# Altium footprint library CAP_TH.PcbLib: 220 footprints (part 13 of 14)
Each footprint in its own frame and in the unit in brackets; x right, y up, seen from the top. Pads: shape width x height; smd on the part's side, far side on the other; paste and mask are expansions set on the pad; w line width, h text height; cw(c..) or ccw(c..) is an arc to the next point about the centre after c.
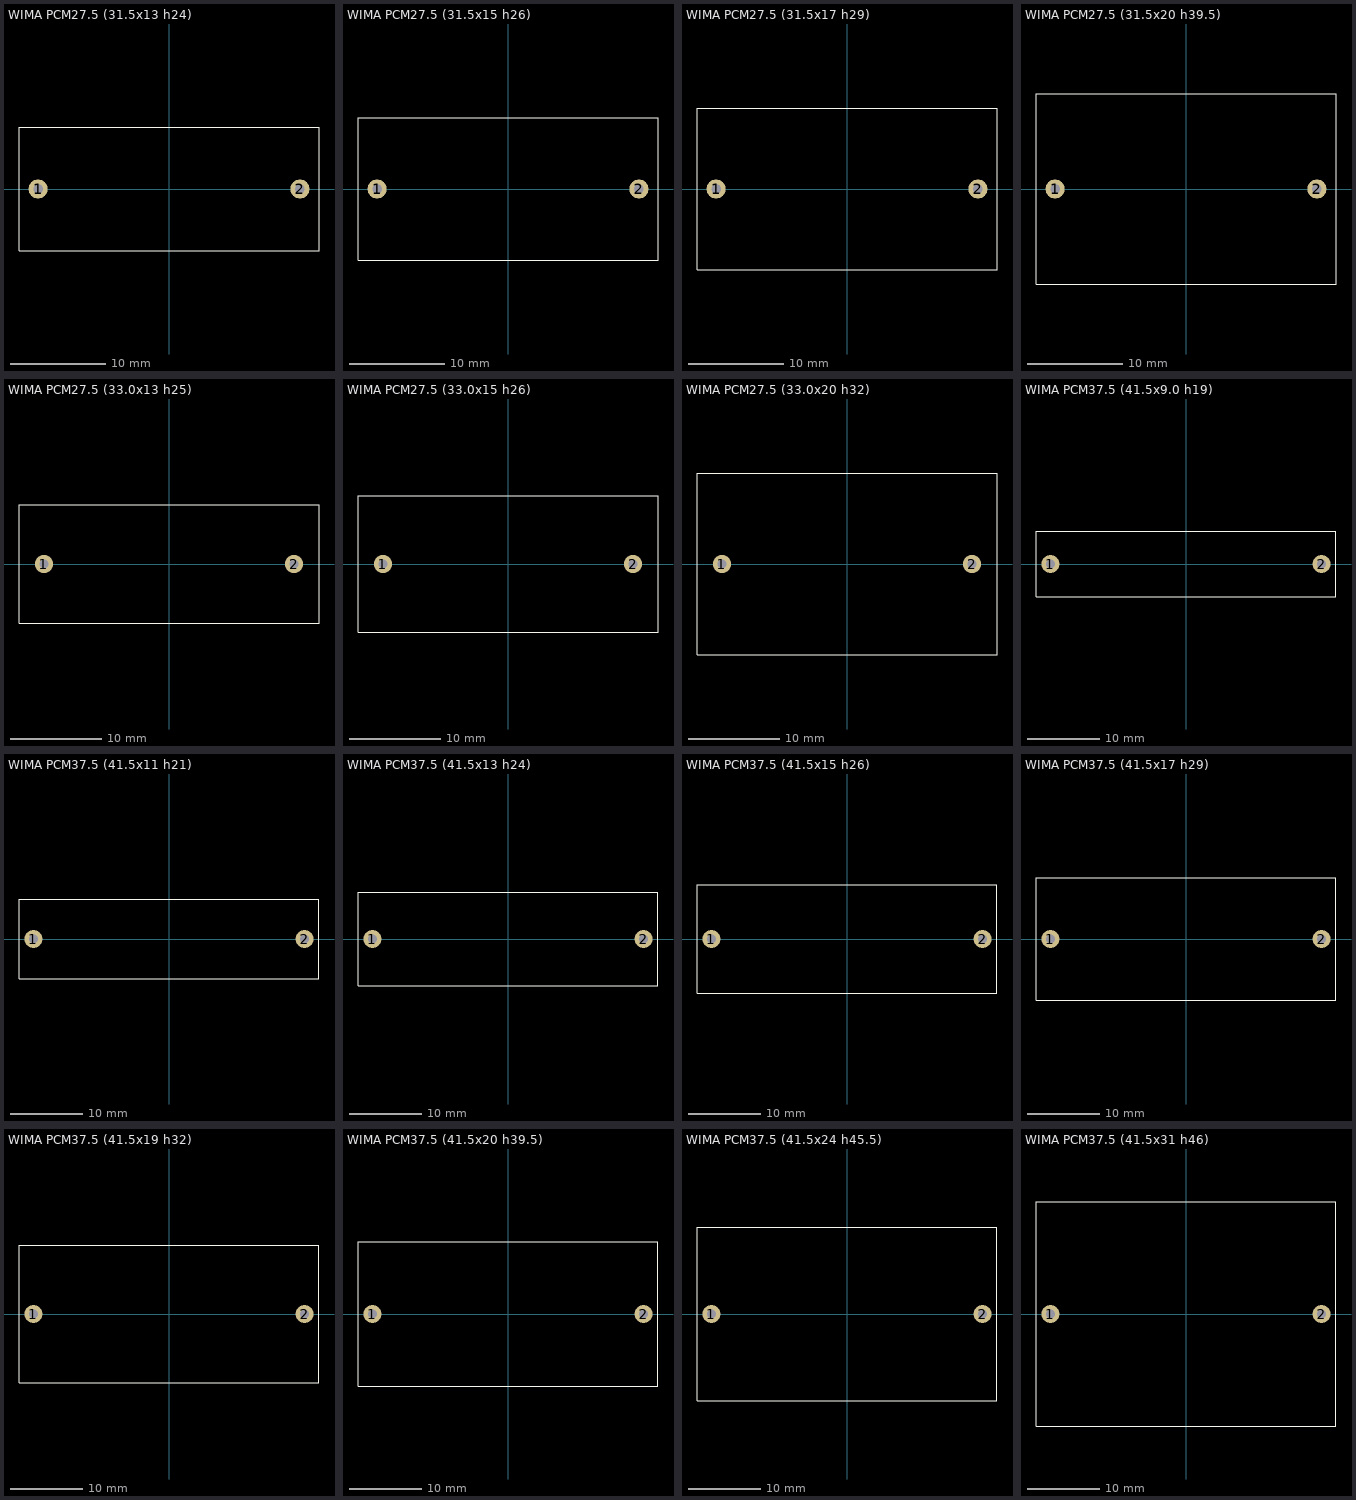
[diagram p12: the footprints below, top view; thin cyan lines are the x and y axes]

## WIMA PCM27.5 (31.5x13 h24) [mm]
pads (2):
  round 2 hole 1: 1(-13.75,0) 2(13.75,0)
Top Overlay:
  lines w0.1: -15.75,-6.5 -15.75,6.5 15.75,6.5 15.75,-6.5 -15.75,-6.5
3D body "WIMA PCM27.5 (31.5x13 h24).STEP": height 24, standoff -2, extent -15.75,-6.5 15.75,6.5

## WIMA PCM27.5 (31.5x15 h26) [mm]
pads (2):
  round 2 hole 1: 1(-13.75,0) 2(13.75,0)
Top Overlay:
  lines w0.1: -15.75,-7.5 -15.75,7.5 15.75,7.5 15.75,-7.5 -15.75,-7.5
3D body "WIMA PCM27.5 (31.5x15 h26).STEP": height 26, standoff -2, extent -15.75,-7.5 15.75,7.5

## WIMA PCM27.5 (31.5x17 h29) [mm]
pads (2):
  round 2 hole 1: 1(-13.75,0) 2(13.75,0)
Top Overlay:
  lines w0.1: -15.75,-8.5 -15.75,8.5 15.75,8.5 15.75,-8.5 -15.75,-8.5
3D body "WIMA PCM27.5 (31.5x17 h29).STEP": height 34.5, standoff -2, extent -15.75,-8.5 15.75,8.5

## WIMA PCM27.5 (31.5x20 h39.5) [mm]
pads (2):
  round 2 hole 1: 1(-13.75,0) 2(13.75,0)
Top Overlay:
  lines w0.1: -15.75,-10 -15.75,10 15.75,10 15.75,-10 -15.75,-10
3D body "WIMA PCM27.5 (31.5x20 h39.5).STEP": height 39.5, standoff -2, extent -15.75,-10 15.75,10

## WIMA PCM27.5 (33.0x13 h25) [mm]
pads (2):
  round 2 hole 1: 1(-13.75,0) 2(13.75,0)
Top Overlay:
  lines w0.1: -16.5,-6.5 16.5,-6.5 16.5,6.5 -16.5,6.5 -16.5,-6.5
3D body "WIMA PCM27.5 (33.0x13 h25).STEP": height 25, standoff -2, extent -16.5,-6.5 16.5,6.5

## WIMA PCM27.5 (33.0x15 h26) [mm]
pads (2):
  round 2 hole 1: 1(-13.75,0) 2(13.75,0)
Top Overlay:
  lines w0.1: -16.5,-7.5 16.5,-7.5 16.5,7.5 -16.5,7.5 -16.5,-7.5
3D body "WIMA PCM27.5 (33.0x15 h26).STEP": height 26, standoff -2, extent -16.5,-7.5 16.5,7.5

## WIMA PCM27.5 (33.0x20 h32) [mm]
pads (2):
  round 2 hole 1: 1(-13.75,0) 2(13.75,0)
Top Overlay:
  lines w0.1: -16.5,-10 16.5,-10 16.5,10 -16.5,10 -16.5,-10
3D body "WIMA PCM27.5 (33.0x20 h32).STEP": height 32, standoff -2, extent -16.5,-10 16.5,10

## WIMA PCM37.5 (41.5x9.0 h19) [mm]
pads (2):
  round 2.5 hole 1.2: 1(-18.75,0) 2(18.75,0)
Top Overlay:
  lines w0.1: -20.75,-4.5 -20.75,4.5 20.75,4.5 20.75,-4.5 -20.75,-4.5
3D body "WIMA PCM37.5 (41.5x9.0 h19).STEP": height 19, standoff -2, extent -20.75,-4.5 20.75,4.5

## WIMA PCM37.5 (41.5x11 h21) [mm]
pads (2):
  round 2.5 hole 1.2: 1(-18.75,0) 2(18.75,0)
Top Overlay:
  lines w0.1: -20.75,-5.5 20.75,-5.5 20.75,5.5 -20.75,5.5 -20.75,-5.5
3D body "WIMA PCM37.5 (41.5x11 h21).STEP": height 21, standoff -2, extent -20.75,-5.5 20.75,5.5

## WIMA PCM37.5 (41.5x13 h24) [mm]
pads (2):
  round 2.5 hole 1.2: 1(-18.75,0) 2(18.75,0)
Top Overlay:
  lines w0.1: -20.75,-6.5 20.75,-6.5 20.75,6.5 -20.75,6.5 -20.75,-6.5
3D body "WIMA PCM37.5 (41.5x13 h24).STEP": height 24, standoff -2, extent -20.75,-6.5 20.75,6.5

## WIMA PCM37.5 (41.5x15 h26) [mm]
pads (2):
  round 2.5 hole 1.2: 1(-18.75,0) 2(18.75,0)
Top Overlay:
  lines w0.1: -20.75,-7.5 20.75,-7.5 20.75,7.5 -20.75,7.5 -20.75,-7.5
3D body "WIMA PCM37.5 (41.5x15 h26).STEP": height 26, standoff -2, extent -20.75,-7.5 20.75,7.5

## WIMA PCM37.5 (41.5x17 h29) [mm]
pads (2):
  round 2.5 hole 1.2: 1(-18.75,0) 2(18.75,0)
Top Overlay:
  lines w0.1: -20.75,-8.5 -20.75,8.5 20.75,8.5 20.75,-8.5 -20.75,-8.5
3D body "WIMA PCM37.5 (41.5x17 h29).STEP": height 29, standoff -2, extent -20.75,-8.5 20.75,8.5

## WIMA PCM37.5 (41.5x19 h32) [mm]
pads (2):
  round 2.5 hole 1.2: 1(-18.75,0) 2(18.75,0)
Top Overlay:
  lines w0.1: -20.75,-9.5 20.75,-9.5 20.75,9.5 -20.75,9.5 -20.75,-9.5
3D body "WIMA PCM37.5 (41.5x19 h32).STEP": height 32, standoff -2, extent -20.75,-9.5 20.75,9.5

## WIMA PCM37.5 (41.5x20 h39.5) [mm]
pads (2):
  round 2.5 hole 1.2: 1(-18.75,0) 2(18.75,0)
Top Overlay:
  lines w0.1: -20.75,-10 20.75,-10 20.75,10 -20.75,10 -20.75,-10
3D body "WIMA PCM37.5 (41.5x20 h39.5).STEP": height 39.5, standoff -2, extent -20.75,-10 20.75,10

## WIMA PCM37.5 (41.5x24 h45.5) [mm]
pads (2):
  round 2.5 hole 1.2: 1(-18.75,0) 2(18.75,0)
Top Overlay:
  lines w0.1: -20.75,-12 -20.75,12 20.75,12 20.75,-12 -20.75,-12
3D body "WIMA PCM37.5 (41.5x24 h45.5).STEP": height 45.5, standoff -2, extent -20.75,-12 20.75,12

## WIMA PCM37.5 (41.5x31 h46) [mm]
pads (2):
  round 2.5 hole 1.2: 1(-18.75,0) 2(18.75,0)
Top Overlay:
  lines w0.1: -20.75,-15.5 20.75,-15.5 20.75,15.5 -20.75,15.5 -20.75,-15.5
3D body "WIMA PCM37.5 (41.5x31 h46).STEP": height 46, standoff -2, extent -20.75,-15.5 20.75,15.5